# Altium footprint library PcbLib_jp.PcbLib: 178 footprints (part 2 of 12)
Each footprint in its own frame and in the unit in brackets; x right, y up, seen from the top. Pads: shape width x height; smd on the part's side, far side on the other; paste and mask are expansions set on the pad; w line width, h text height; cw(c..) or ccw(c..) is an arc to the next point about the centre after c.
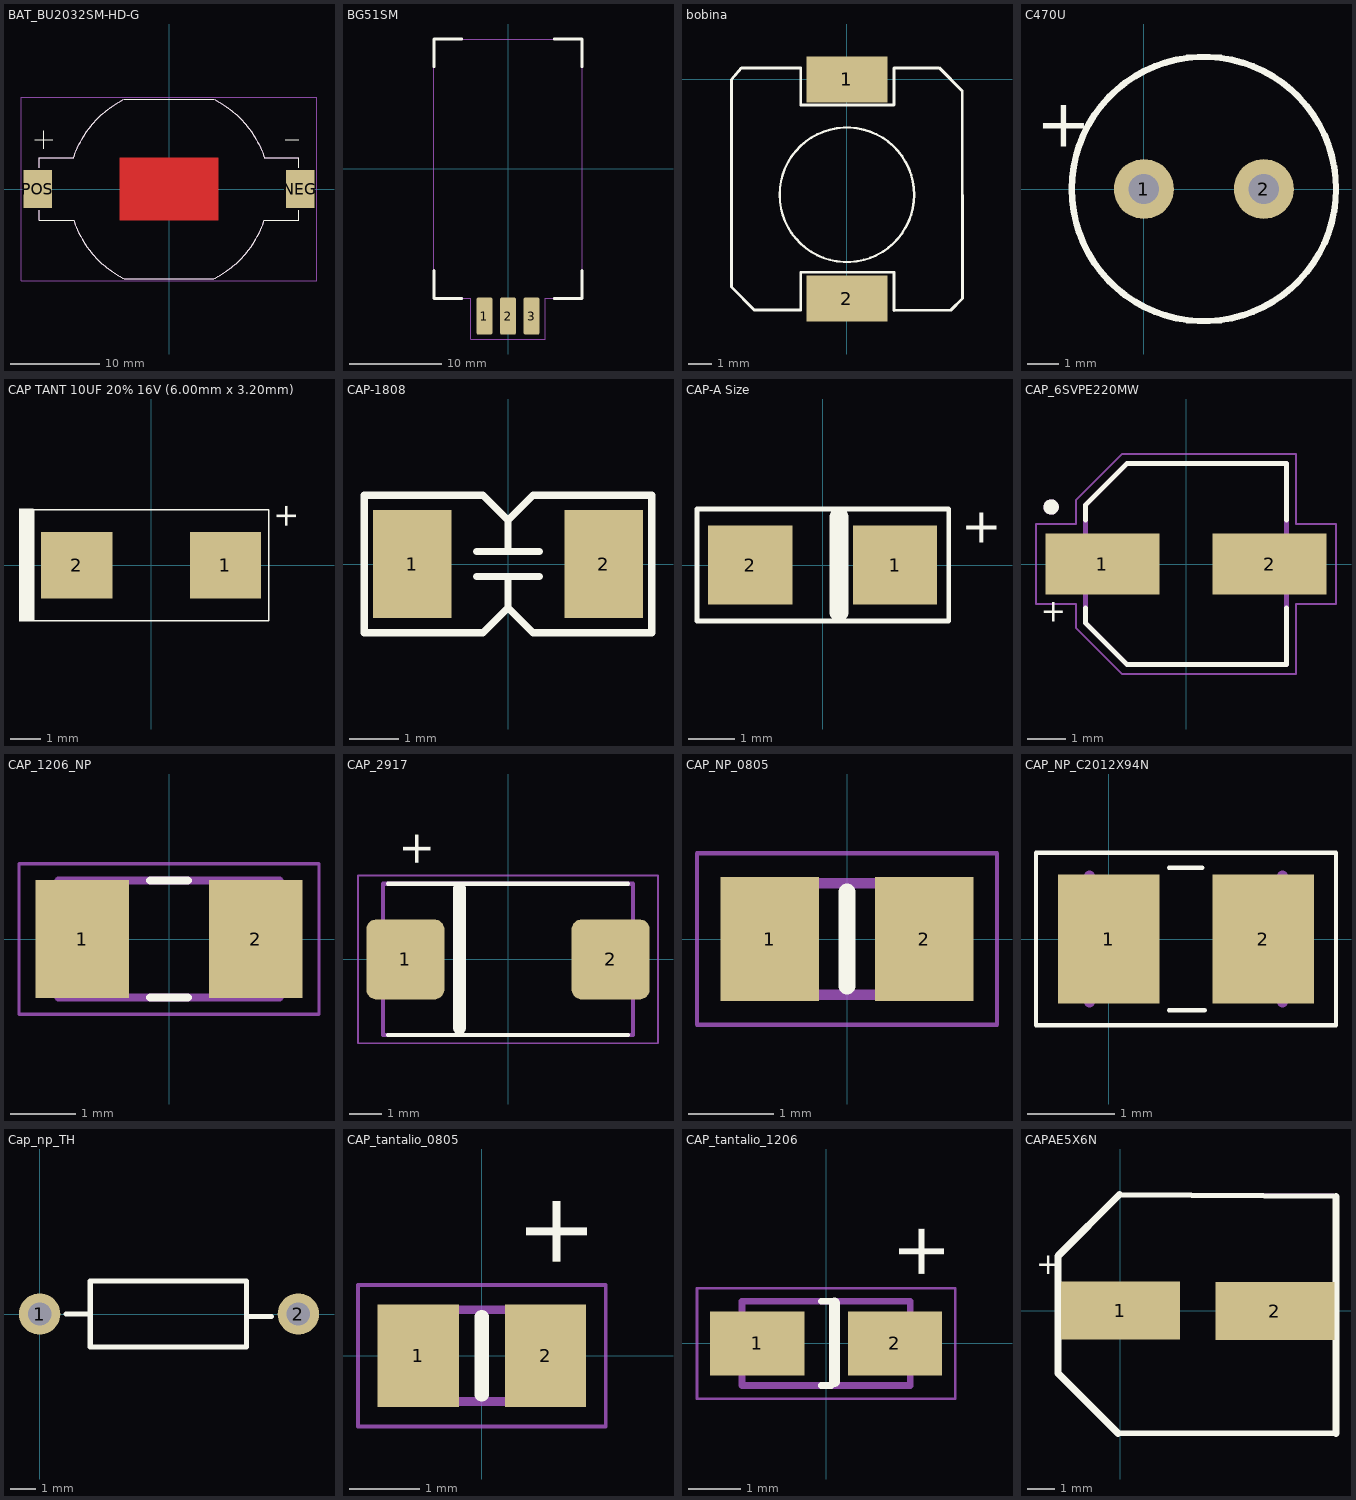
[diagram p1: the footprints below, top view; thin cyan lines are the x and y axes]

## BAT_BU2032SM-HD-G [mm]
pads (2):
  rect 3.2x4.2 smd: NEG(14.65,0) POS(-14.65,0)
Top Layer:
  region: 5.5,-3.5 -5.5,-3.5 -5.5,3.5 5.5,3.5
Top Overlay:
  lines w0.127: -15,5.5 -13,5.5 ; -14.5,-2.4 -14.5,-3.5 -10.645,-3.5 -10.581,-3.681 -10.458,-4.024 -10.35,-4.287 -10.242,-4.538 -10.058,-4.937 -9.88,-5.282 -9.7,-5.594 -9.524,-5.892 -9.168,-6.436 -8.897,-6.809 -8.516,-7.277 -8.022,-7.82 -7.774,-8.061 -7.55,-8.273 -7.354,-8.447 -7.193,-8.586 -7,-8.746 -6.779,-8.919 -6.628,-9.03 -6.375,-9.211 -6.049,-9.433 -5.741,-9.619 -5.497,-9.758 -5.166,-9.939 -5.013,-10 ; -14.5,2.4 -14.5,3.5 -10.645,3.5 -10.581,3.681 -10.458,4.024 -10.35,4.287 -10.242,4.538 -10.058,4.937 -9.88,5.282 -9.7,5.594 -9.524,5.892 -9.168,6.436 -8.897,6.809 -8.516,7.277 -8.022,7.82 -7.774,8.061 -7.55,8.273 -7.354,8.447 -7.193,8.586 -7,8.746 -6.779,8.919 -6.628,9.03 -6.375,9.211 -6.049,9.433 -5.741,9.619 -5.497,9.758 -5.166,9.939 -5.013,10 ; -14,4.5 -14,6.5 ; -5,-10 5,-10 ; -5,10 5,10 ; 5.013,-10 5.166,-9.939 5.497,-9.758 5.741,-9.619 6.049,-9.433 6.375,-9.211 6.628,-9.03 6.779,-8.919 7,-8.746 7.193,-8.586 7.354,-8.447 7.55,-8.273 7.774,-8.061 8.022,-7.82 8.516,-7.277 8.897,-6.809 9.168,-6.436 9.524,-5.892 9.7,-5.594 9.88,-5.282 10.058,-4.937 10.242,-4.538 10.35,-4.287 10.458,-4.024 10.581,-3.681 10.645,-3.5 14.5,-3.5 14.5,-2.4 ; 5.013,10 5.166,9.939 5.497,9.758 5.741,9.619 6.049,9.433 6.375,9.211 6.628,9.03 6.779,8.919 7,8.746 7.193,8.586 7.354,8.447 7.55,8.273 7.774,8.061 8.022,7.82 8.516,7.277 8.897,6.809 9.168,6.436 9.524,5.892 9.7,5.594 9.88,5.282 10.058,4.937 10.242,4.538 10.35,4.287 10.458,4.024 10.581,3.681 10.645,3.5 14.5,3.5 14.5,2.4 ; 13,5.5 14.5,5.5
Top Solder:
  region: 5.6,-3.6 -5.6,-3.6 -5.6,3.6 5.6,3.6
Mechanical 13:
  lines w0.127: -14.5,-2.4 -14.5,-3.5 -10.645,-3.5 -10.581,-3.681 -10.458,-4.024 -10.35,-4.287 -10.242,-4.538 -10.058,-4.937 -9.88,-5.282 -9.7,-5.594 -9.524,-5.892 -9.168,-6.436 -8.897,-6.809 -8.516,-7.277 -8.022,-7.82 -7.774,-8.061 -7.55,-8.273 -7.354,-8.447 -7.193,-8.586 -7,-8.746 -6.779,-8.919 -6.628,-9.03 -6.375,-9.211 -6.049,-9.433 -5.741,-9.619 -5.497,-9.758 -5.166,-9.939 -5.013,-10 ; -14.5,2.4 -14.5,3.5 -10.645,3.5 -10.581,3.681 -10.458,4.024 -10.35,4.287 -10.242,4.538 -10.058,4.937 -9.88,5.282 -9.7,5.594 -9.524,5.892 -9.168,6.436 -8.897,6.809 -8.516,7.277 -8.022,7.82 -7.774,8.061 -7.55,8.273 -7.354,8.447 -7.193,8.586 -7,8.746 -6.779,8.919 -6.628,9.03 -6.375,9.211 -6.049,9.433 -5.741,9.619 -5.497,9.758 -5.166,9.939 -5.013,10 ; -5,-10 5,-10 ; -5,10 5,10 ; 5.013,-10 5.166,-9.939 5.497,-9.758 5.741,-9.619 6.049,-9.433 6.375,-9.211 6.628,-9.03 6.779,-8.919 7,-8.746 7.193,-8.586 7.354,-8.447 7.55,-8.273 7.774,-8.061 8.022,-7.82 8.516,-7.277 8.897,-6.809 9.168,-6.436 9.524,-5.892 9.7,-5.594 9.88,-5.282 10.058,-4.937 10.242,-4.538 10.35,-4.287 10.458,-4.024 10.581,-3.681 10.645,-3.5 14.5,-3.5 14.5,-2.4 ; 5.013,10 5.166,9.939 5.497,9.758 5.741,9.619 6.049,9.433 6.375,9.211 6.628,9.03 6.779,8.919 7,8.746 7.193,8.586 7.354,8.447 7.55,8.273 7.774,8.061 8.022,7.82 8.516,7.277 8.897,6.809 9.168,6.436 9.524,5.892 9.7,5.594 9.88,5.282 10.058,4.937 10.242,4.538 10.35,4.287 10.458,4.024 10.581,3.681 10.645,3.5 14.5,3.5 14.5,2.4
Mechanical 15:
  lines w0.05: -16.5,-10.25 -16.5,10.25 16.5,10.25 16.5,-10.25 -16.5,-10.25
3D body "BU2032SM-HD-G--3DModel-STEP-1.STEP": height 5.3, standoff 0, extent -15.99,-10.07 16.01,9.93

## BG51SM [mm] "Nuclear Beta and Gamma Radiation Sensor"
height 7
pads (3):
  rrect20% 1.7x4 smd: 1(-2.54,-15.9) 2(0,-15.9) 3(2.54,-15.9)
Top Overlay:
  lines w0.305: -8,-11 -8,-14 -5,-14 ; -8,11 -8,14 -5,14 ; 5,-14 8,-14 8,-11 ; 5,14 8,14 8,11
Mechanical 15:
  lines w0.051: -8,-14 -8,14 8,14 8,-14 5,-14 4,-14 4,-18.375 -4,-18.375 -4,-14 -5,-14 -8,-14
3D body "BG51.stp": height 7, standoff 0, extent -8,-17.5 8,14

## bobina [mil]
pads (2):
  rect 137.8x78.73 smd: 1(0,0) 2(0,-374)
Top Overlay:
  circle w3.93: c0,-196.85 r114.77
  lines w5: -196.83,-354.32 -196.83,0 -180,19.67 -78.73,19.67 -78.73,-44 80,-44 80,19.67 157.47,19.67 196.83,-19.7 197.15,-373.68 177.15,-393.68 80,-394 80,-329 -78.73,-329 -78.73,-393.68 -157.47,-393.68 -196.83,-354.32
3D body "Coilcraft-MSS1038.STEP": height 212.6, standoff 55.12, extent -197.79,-390.75 203.79,14.76

## C470U [mil]
pads (2):
  round 75 / inner round 60 / far side round 75 hole 38 square: 1(0,0)
  round 75 / inner round 60 / far side round 75 hole 38: 2(150,0)
Top Overlay:
  circle w8: c75,0 r165.3
  text "+" at -135,53 h60
3D body "CircuitWorks-ELECTROLITIC CAPACITOR RADIAL 8X12.STEP": height 476.38, standoff -94.49, extent -82.48,-157.47 232.49,157.49

## CAP TANT 10UF 20% 16V (6.00mm x 3.20mm) [mm]
pads (2):
  rect 2.37x2.21 smd: 1(2.475,0) 2(-2.475,0)
Top Overlay:
  rectangle: -4.394,-1.88 -3.91,1.88
  lines w0.05: -3.91,-1.85 -3.91,1.85 ; -3.91,-1.85 3.91,-1.85 3.91,1.85 -3.91,1.85 ; -3.91,-1.85 -3.91,1.85
  text "-" at -3.785,1.194 h0.76
  text "+" at 4.826,1.194 h0.76
3D body: height 0.25, standoff -15.2, extent -1.321,0.406 -1.321,0.406
3D body: height 0.25, standoff -15.2, extent 5.258,0.178 5.258,0.178
3D body "t491c106m016at.stp": height 2.81, standoff 0.01, extent -3.023,-1.824 3.277,1.676

## CAP-1808 [mm] "Ceramic CAP 1808(4520)"
height 3.9
pads (2):
  rect 1.6x2.2 smd: 1(-1.95,0) 2(1.95,0)
Top Overlay:
  lines w0.15: -0.635,-0.254 0.635,-0.254 ; -0.635,0.254 0.635,0.254 ; 0,-0.254 0,-0.889 ; 0,0.254 0,0.889 ; 0,-0.889 -0.508,-1.397 -2.921,-1.397 -2.921,1.397 -0.508,1.397 0,0.889 ; 0,-0.889 0.508,-1.397 2.921,-1.397 2.921,1.397 0.508,1.397 0.127,1.016 0,0.889
3D body "User Library-Chip Cap_MLCC_1808 (4520)_K.STEP": height 2, standoff 0, extent -2.25,-1.016 2.25,1.014

## CAP-A Size [mm] "Tantal CAP A Size EIA/IECQ 3216"
height 2.5
pads (2):
  rect 1.8x1.7 smd: 1(1.55,0) 2(-1.55,0)
Top Overlay:
  lines w0.1: -2.69,0.2 -2.69,-1.2 2.7,-1.2 2.7,1.2 -2.69,1.2 -2.69,0.22
  lines w0.4: 0.35,-1.01 0.35,1.03
  text "+" at 2.972,0.483 h0.76
3D body "User Library-Tantalum Capacitor Case A.STEP": height 1.75, standoff 0.1, extent -1.619,-0.813 1.771,0.787

## CAP_6SVPE220MW [mm]
pads (2):
  rect 3x1.6 smd: 1(-2.2,0) 2(2.2,0)
Top Overlay:
  circle w0.2: c-3.55,1.5 r0.1
  lines w0.127: -2.65,-1.15 -2.65,-1.55 -1.55,-2.65 2.65,-2.65 2.65,-1.15 ; -2.65,1.15 -2.65,1.55 -1.55,2.65 2.65,2.65 2.65,1.15
  text "+" at -3.83,-1.72 h1
Mechanical 13:
  circle w0.2: c-3.55,1.5 r0.1
  lines w0.127: -2.65,-1.55 -2.65,1.55 -1.55,2.65 2.65,2.65 2.65,-2.65 -1.55,-2.65 -2.65,-1.55
Mechanical 15:
  lines w0.05: -3.95,-1.05 -3.95,1.05 -2.9,1.05 -2.9,1.675 -1.675,2.9 2.9,2.9 2.9,1.05 3.95,1.05 3.95,-1.05 2.9,-1.05 2.9,-2.9 -1.675,-2.9 -2.9,-1.675 -2.9,-1.05 -3.95,-1.05
3D body "6SVPE220MW.STEP": height 5.9, standoff 0, extent -2.96,-2.61 3.04,2.69
3D body: height 4.32, standoff -4.32, extent -3.57,1.68 -3.57,1.68
3D body: height 4.32, standoff -4.32, extent -3.59,1.56 -3.59,1.56
3D body: height 4.32, standoff -4.32, extent -3.53,1.48 -3.53,1.48
3D body: height 4.32, standoff -4.32, extent -3.82,2.12 -3.82,2.12
3D body: height 4.32, standoff -4.32, extent -3.44,1.74 -3.44,1.74
3D body: height 4.32, standoff -4.32, extent -3.44,1.56 -3.44,1.56

## CAP_1206_NP [mm]
pads (2):
  rect 1.44x1.82 smd: 1(-1.336,0) 2(1.336,0)
Top Overlay:
  lines w0.127: -0.29,-0.9 0.29,-0.9 ; -0.29,0.9 0.29,0.9
Mechanical 13:
  lines w0.127: -1.7,-0.9 -1.7,0.9 1.7,0.9 1.7,-0.9 -1.7,-0.9
Mechanical 15:
  lines w0.05: -2.308,-1.158 -2.308,1.158 2.308,1.158 2.308,-1.158 -2.308,-1.158
3D body "User Library-Vhip cap 1206.STEP": height 1.85, standoff 0.15, extent -1.66,-0.87 1.54,0.87

## CAP_2917 [mm]
pads (2):
  rrect25% 2.37x2.43 smd: 1(-3.12,0) 2(3.12,0)
Top Overlay:
  lines w0.127: -3.65,-2.3 3.65,-2.3 ; -3.65,2.3 3.65,2.3
  lines w0.4: -1.47,-2.09 -1.47,2.16
  text "+" at -2.35,2.79 h1
Mechanical 13:
  lines w0.127: -3.8,-2.3 -3.8,2.3 3.8,2.3 3.8,-2.3 -3.8,-2.3
Mechanical 15:
  lines w0.05: -4.56,-2.55 4.56,-2.55 4.56,2.55 -4.56,2.55 -4.56,-2.55
3D body "User Library-AVX_D_CASE.STEP": height 3.01, standoff 0, extent -3.71,-2.285 3.69,2.165

## CAP_NP_0805 [mm]
pads (2):
  rect 1.15x1.45 smd: 1(-0.9,0) 2(0.9,0)
Top Overlay:
  lines w0.2: 0,-0.55 0,0.55
Mechanical 13:
  region: 1,-0.65 0.5,-0.65 0.5,0.65 1,0.65
  region: -0.5,-0.65 -1,-0.65 -1,0.65 -0.5,0.65
  lines w0.127: -1,-0.65 -1,0.65 1,0.65 1,-0.65 -1,-0.65
Mechanical 15:
  lines w0.05: -1.75,-1 -1.75,1 1.75,1 1.75,-1 -1.75,-1
3D body "08055C104MAT2A.step": height 1.04, standoff 0.1, extent -1.045,-0.625 0.965,0.625

## CAP_NP_C2012X94N [mm]
pads (2):
  rect 1.16x1.47 smd: 1(0,0) 2(1.76,0)
Top Overlay:
  lines w0.05: 0.686,-0.813 1.092,-0.813 ; 0.686,0.813 1.067,0.813 ; -0.833,-0.983 2.593,-0.983 2.593,0.983 -0.833,0.983 -0.833,-0.983
Mechanical 13:
  lines w0.127: -0.22,-0.72 -0.22,0.72 -0.22,-0.72 ; 1.98,-0.72 1.98,0.72 1.98,-0.72
3D body "User Library-CapCeramic_Kemet_0603_1608.STEP": height 0.8, standoff 0, extent 0.055,-0.4 1.655,0.4

## Cap_np_TH [mm] "Axial Device, Thru-Hole; 2 Leads; 0.5 in Pin Spacing"
height 2.54
pads (2):
  round 1.6 hole 0.9: 1(0,0) 2(10,0)
Top Overlay:
  lines w0.2: 1.016,0 1.956,0 ; 8.052,-0.102 8.966,-0.102 ; 1.956,-1.27 7.722,-1.27 8.001,-1.27 8.001,1.27 1.956,1.27 1.956,-1.27
3D body "User Library-PB-5R0H104-R.STEP": height 4, standoff -11.02, extent -0.672,-2.972 10.628,3.028

## CAP_tantalio_0805 [mm]
pads (2):
  rect 1.15x1.45 smd: 1(-0.9,0) 2(0.9,0)
Top Overlay:
  lines w0.2: 0,-0.55 0,0.55
  text "+" at 1.49,1.18 h1
Mechanical 13:
  region: -0.5,-0.65 -1,-0.65 -1,0.65 -0.5,0.65
  region: 1,-0.65 0.5,-0.65 0.5,0.65 1,0.65
  lines w0.127: -1,-0.65 1,-0.65 1,0.65 -1,0.65 -1,-0.65
Mechanical 15:
  lines w0.05: -1.75,-1 1.75,-1 1.75,1 -1.75,1 -1.75,-1
3D body "08055C104MAT2A.step": height 1.22, standoff -0.03, extent -0.995,-0.47 1.015,0.47

## CAP_tantalio_1206 [mm]
pads (2):
  rect 1.79x1.21 smd: 1(-1.31,0) 2(1.31,0)
Top Overlay:
  lines w0.127: -0.095,-0.8 0.095,-0.8 ; -0.095,0.8 0.095,0.8
  lines w0.203: 0.16,-0.73 0.16,0.77
  text "+" at 2.25,1.17 h1
Mechanical 13:
  lines w0.127: -1.6,-0.8 1.6,-0.8 1.6,0.8 -1.6,0.8 -1.6,-0.8
Mechanical 15:
  lines w0.05: -2.455,-1.05 2.455,-1.05 2.455,1.05 -2.455,1.05 -2.455,-1.05
3D body "TPSA225M010R1800.STEP": height 1.8, standoff 0, extent -1.65,-0.81 1.55,0.79

## CAPAE5X6N [mm]
pads (2):
  rect 4.3x2.1 smd: 1(0,0) 2(5.588,-0.013)
Top Overlay:
  lines w0.2: -0.076,-4.432 7.795,-4.432 ; -0.036,4.193 7.795,4.135
  lines w0.254: -0.076,-4.432 -2.245,-2.264 -2.245,1.984 -0.036,4.193 ; 7.795,-4.432 7.795,4.135
  text "+" at -3.048,1.321 h0.76
Mechanical 13:
  lines w0.1: -2.245,-2.264 -2.188,1.984 ; -2.245,1.984 -0.036,4.193 7.689,4.193 ; -2.007,-2.502 -0.051,-4.432 ; -0.172,-4.432 7.795,-4.432 7.795,4.135
3D body "User Library-9D.STEP": height 6.42, standoff 0, extent -0.206,-2.476 5.794,2.823